# Altium schematic symbol library TI - ADC.SchLib: 2198 symbols (part 33 of 130) (continued)
## ADS5240IPAPG4
designator U?
4-Channel, 12-Bit, 40 MSPS ADC with Serial LVDS Interface, -40 to 85 degC, 64-pin QFP (PAP64), Green (RoHS & no Sb/Br); Manufacturer: Texas Instruments; PartNumber: ADS5240IPAPG4; # Input Channels: 4; Analog Voltage AV/DD(Max)(V): 3.6; Analog Voltage AV/DD(Min)(V): 3; Architecture: Pipeline; ENOB(Bits): 11.3; INL(Max)(+/-LSB): 2; Interface: Parallel LVDS; Resolution(Bits): 12; Sample Rate (max)(SPS): 40M; SFDR(dB): 87; SINAD(dB): 70; SNR(dB): 70.5; SubFamily: High Speed ADC (>10MSPS); DatasheetVersion: SBAS326E; PackageVersion: 4147702/C, 08/2003; PackageReference: PAP64-5900X5900TP; PackageDescription: 64-Pin PowerPAD(TM) Plastic Quad Flatpack, Body 10 x 10 mm, Pitch 0.5 mm; Supplier 1: Digi-Key; Supplier Part Number 1: ADS8322Y/250TR-ND; Digital Supply(Max)(V): 3.6; Digital Supply(Min)(V): 3; Eco-Plan: Green (RoHS & no Sb/Br); Mounting Technology: Surface Mount; Code_JEDEC: MS-026; ComponentLink1Description: Manufacturer URL; ComponentLink1URL: http://www.ti.com/; ComponentLink2Description: Datasheet; ComponentLink2URL: http://www.ti.com/general/docs/lit/getliterature.tsp?genericPartNumber=ADS5240&fileType=pdf; ComponentLink3Description: Package Specification; ComponentLink3URL: http://www.ti.com/lit/ml/mpqf071b/mpqf071b.pdf
footprint TI-PAP64-5900X5900TP_N (QFP, 64-Leads, Body 10x10mm, Pitch 0.5mm, Thermal Pad 6.5x6.5mm, IPC Medium Density)
footprint TI-PAP64-5900X5900TP_L (QFP, 64-Leads, Body 10x10mm, Pitch 0.5mm, Thermal Pad 6.5x6.5mm, IPC High Density)
footprint TI-PAP64-5900X5900TP_M (QFP, 64-Leads, Body 10x10mm, Pitch 0.5mm, Thermal Pad 6.5x6.5mm, IPC Low Density)
part A pins: 2 IN1P (in) "Channel 1 Differential Analog Input High", 3 IN1N (in) "Channel 1 Differential Analog Input Low", 7 IN2P (in) "Channel 2 Differential Analog Input High", 8 IN2N (in) "Channel 2 Differential Analog Input Low", 12 PD (in) "Power-Down; 0 = Normal, 1 = Power-Down. Weak pull-down to ground.", 15 LCLKP (out) "Positive LVDS Clock", 16 LCLKN (out) "Negative LVDS Clock", 19 OUT1P (out) "Channel 1 Positive LVDS Data Output", 20 OUT1N (out) "Channel 1 Negative LVDS Data Output", 23 OUT2P (out) "Channel 2 Positive LVDS Data Output", 24 OUT2N (out) "Channel 2 Negative LVDS Data Output", 25 OUT3P (out) "Channel 3 Positive LVDS Data Output", 26 OUT3N (out) "Channel 3 Negative LVDS Data Output", 29 OUT4P (out) "Channel 4 Positive LVDS Data Output", 30 OUT4N (out) "Channel 4 Negative LVDS Data Output", 33 ADCLKP (out) "Positive LVDS ADC Clock Output", 34 ADCLKN (out) "Negative LVDS ADC Clock Output", 37 ~{RESET} (in) "Reset to Default; 0 = Reset, 1 = Normal. Weak pull-down to ground.", 41 IN3P (in) "Channel 3 Differential Analog Input High", 42 IN3N (in) "Channel 3 Differential Analog Input Low", 46 IN4P (in) "Channel 4 Differential Analog Input High", 47 IN4N (in) "Channel 4 Differential Analog Input Low", 50 ISET (in) "Bias Current Setting Resistor of 56.2kOhm to Ground", 51 VCM (out) "Common-Mode Output Voltage", 52 REFB "Reference Bottom Voltage (2Ohm resistor in series with a capacitor >= 0.1uF to ground)", 53 REFT "Reference Top Voltage (2Ohm resistor in series with a capacitor >= 0.1uF to ground)", 54 INT/~{EXT} (in) "Internal/External Reference Select; 0 = External, 1 = Internal. Weak pull-up to supply.", 56 ADCLK (in) "Data Converter Clock Input", 61 ~{CS} (in) "Chip Select; 0 = Select, 1 = No Select", 62 SDATA (in) "Serial Data Input", 63 SCLK (in) "Serial Data Clock"
part B pins: 1 AVDD (power) "Analog Power Supply", 4 AVSS (power) "Analog Ground", 5 AVDD (power) "Analog Power Supply", 6 AVSS (power) "Analog Ground", 9 AVSS (power) "Analog Ground", 10 AVDD (power) "Analog Power Supply", 11 LVSS (power) "LVDS Ground", 13 LVSS (power) "LVDS Ground", 14 LVSS (power) "LVDS Ground", 21 LVDD (power) "LVDS Power Supply", 22 LVSS (power) "LVDS Ground", 27 LVDD (power) "LVDS Power Supply", 28 LVSS (power) "LVDS Ground", 35 LVSS (power) "LVDS Ground", 36 LVSS (power) "LVDS Ground", 38 LVSS (power) "LVDS Ground", 39 AVDD (power) "Analog Power Supply", 40 AVSS (power) "Analog Ground", 43 AVSS (power) "Analog Ground", 44 AVDD (power) "Analog Power Supply", 45 AVSS (power) "Analog Ground", 48 AVDD (power) "Analog Power Supply", 49 AVSS (power) "Analog Ground", 55 AVDD (power) "Analog Power Supply", 57 AVSS (power) "Analog Ground", 58 AVSS (power) "Analog Ground", 59 AVSS (power) "Analog Ground", 60 AVDD (power) "Analog Power Supply", 64 AVSS (power) "Analog Ground", 65 EP
part C pins: 17 NC "No Connection", 18 NC "No Connection", 31 NC "No Connection", 32 NC "No Connection"

## ADS5240IPAPT
designator U?
4-Channel, 12-Bit, 40 MSPS ADC with Serial LVDS Interface, -40 to 85 degC, 64-pin QFP (PAP64), Green (RoHS & no Sb/Br); Manufacturer: Texas Instruments; PartNumber: ADS5240IPAPT; # Input Channels: 4; Analog Voltage AV/DD(Max)(V): 3.6; Analog Voltage AV/DD(Min)(V): 3; Architecture: Pipeline; ENOB(Bits): 11.3; INL(Max)(+/-LSB): 2; Interface: Parallel LVDS; Resolution(Bits): 12; Sample Rate (max)(SPS): 40M; SFDR(dB): 87; SINAD(dB): 70; SNR(dB): 70.5; SubFamily: High Speed ADC (>10MSPS); DatasheetVersion: SBAS326E; PackageVersion: 4147702/C, 08/2003; PackageReference: PAP64-5900X5900TP; PackageDescription: 64-Pin PowerPAD(TM) Plastic Quad Flatpack, Body 10 x 10 mm, Pitch 0.5 mm; Supplier 1: Digi-Key; Supplier Part Number 1: ADS8322Y/250G4-ND; Digital Supply(Max)(V): 3.6; Digital Supply(Min)(V): 3; Eco-Plan: Green (RoHS & no Sb/Br); Mounting Technology: Surface Mount; Code_JEDEC: MS-026; ComponentLink1Description: Manufacturer URL; ComponentLink1URL: http://www.ti.com/; ComponentLink2Description: Datasheet; ComponentLink2URL: http://www.ti.com/general/docs/lit/getliterature.tsp?genericPartNumber=ADS5240&fileType=pdf; ComponentLink3Description: Package Specification; ComponentLink3URL: http://www.ti.com/lit/ml/mpqf071b/mpqf071b.pdf
footprint TI-PAP64-5900X5900TP_N (QFP, 64-Leads, Body 10x10mm, Pitch 0.5mm, Thermal Pad 6.5x6.5mm, IPC Medium Density)
footprint TI-PAP64-5900X5900TP_L (QFP, 64-Leads, Body 10x10mm, Pitch 0.5mm, Thermal Pad 6.5x6.5mm, IPC High Density)
footprint TI-PAP64-5900X5900TP_M (QFP, 64-Leads, Body 10x10mm, Pitch 0.5mm, Thermal Pad 6.5x6.5mm, IPC Low Density)
part A pins: 2 IN1P (in) "Channel 1 Differential Analog Input High", 3 IN1N (in) "Channel 1 Differential Analog Input Low", 7 IN2P (in) "Channel 2 Differential Analog Input High", 8 IN2N (in) "Channel 2 Differential Analog Input Low", 12 PD (in) "Power-Down; 0 = Normal, 1 = Power-Down. Weak pull-down to ground.", 15 LCLKP (out) "Positive LVDS Clock", 16 LCLKN (out) "Negative LVDS Clock", 19 OUT1P (out) "Channel 1 Positive LVDS Data Output", 20 OUT1N (out) "Channel 1 Negative LVDS Data Output", 23 OUT2P (out) "Channel 2 Positive LVDS Data Output", 24 OUT2N (out) "Channel 2 Negative LVDS Data Output", 25 OUT3P (out) "Channel 3 Positive LVDS Data Output", 26 OUT3N (out) "Channel 3 Negative LVDS Data Output", 29 OUT4P (out) "Channel 4 Positive LVDS Data Output", 30 OUT4N (out) "Channel 4 Negative LVDS Data Output", 33 ADCLKP (out) "Positive LVDS ADC Clock Output", 34 ADCLKN (out) "Negative LVDS ADC Clock Output", 37 ~{RESET} (in) "Reset to Default; 0 = Reset, 1 = Normal. Weak pull-down to ground.", 41 IN3P (in) "Channel 3 Differential Analog Input High", 42 IN3N (in) "Channel 3 Differential Analog Input Low", 46 IN4P (in) "Channel 4 Differential Analog Input High", 47 IN4N (in) "Channel 4 Differential Analog Input Low", 50 ISET (in) "Bias Current Setting Resistor of 56.2kOhm to Ground", 51 VCM (out) "Common-Mode Output Voltage", 52 REFB "Reference Bottom Voltage (2Ohm resistor in series with a capacitor >= 0.1uF to ground)", 53 REFT "Reference Top Voltage (2Ohm resistor in series with a capacitor >= 0.1uF to ground)", 54 INT/~{EXT} (in) "Internal/External Reference Select; 0 = External, 1 = Internal. Weak pull-up to supply.", 56 ADCLK (in) "Data Converter Clock Input", 61 ~{CS} (in) "Chip Select; 0 = Select, 1 = No Select", 62 SDATA (in) "Serial Data Input", 63 SCLK (in) "Serial Data Clock"
part B pins: 1 AVDD (power) "Analog Power Supply", 4 AVSS (power) "Analog Ground", 5 AVDD (power) "Analog Power Supply", 6 AVSS (power) "Analog Ground", 9 AVSS (power) "Analog Ground", 10 AVDD (power) "Analog Power Supply", 11 LVSS (power) "LVDS Ground", 13 LVSS (power) "LVDS Ground", 14 LVSS (power) "LVDS Ground", 21 LVDD (power) "LVDS Power Supply", 22 LVSS (power) "LVDS Ground", 27 LVDD (power) "LVDS Power Supply", 28 LVSS (power) "LVDS Ground", 35 LVSS (power) "LVDS Ground", 36 LVSS (power) "LVDS Ground", 38 LVSS (power) "LVDS Ground", 39 AVDD (power) "Analog Power Supply", 40 AVSS (power) "Analog Ground", 43 AVSS (power) "Analog Ground", 44 AVDD (power) "Analog Power Supply", 45 AVSS (power) "Analog Ground", 48 AVDD (power) "Analog Power Supply", 49 AVSS (power) "Analog Ground", 55 AVDD (power) "Analog Power Supply", 57 AVSS (power) "Analog Ground", 58 AVSS (power) "Analog Ground", 59 AVSS (power) "Analog Ground", 60 AVDD (power) "Analog Power Supply", 64 AVSS (power) "Analog Ground", 65 EP
part C pins: 17 NC "No Connection", 18 NC "No Connection", 31 NC "No Connection", 32 NC "No Connection"

## ADS5240IPAPTG4
designator U?
4-Channel, 12-Bit, 40 MSPS ADC with Serial LVDS Interface, -40 to 85 degC, 64-pin QFP (PAP64), Green (RoHS & no Sb/Br); Manufacturer: Texas Instruments; PartNumber: ADS5240IPAPTG4; # Input Channels: 4; Analog Voltage AV/DD(Max)(V): 3.6; Analog Voltage AV/DD(Min)(V): 3; Architecture: Pipeline; ENOB(Bits): 11.3; INL(Max)(+/-LSB): 2; Interface: Parallel LVDS; Resolution(Bits): 12; Sample Rate (max)(SPS): 40M; SFDR(dB): 87; SINAD(dB): 70; SNR(dB): 70.5; SubFamily: High Speed ADC (>10MSPS); DatasheetVersion: SBAS326E; PackageVersion: 4147702/C, 08/2003; PackageReference: PAP64-5900X5900TP; PackageDescription: 64-Pin PowerPAD(TM) Plastic Quad Flatpack, Body 10 x 10 mm, Pitch 0.5 mm; Supplier 1: Digi-Key; Supplier Part Number 1: ADS8322Y/2KTR-ND; Digital Supply(Max)(V): 3.6; Digital Supply(Min)(V): 3; Eco-Plan: Green (RoHS & no Sb/Br); Mounting Technology: Surface Mount; Code_JEDEC: MS-026; ComponentLink1Description: Manufacturer URL; ComponentLink1URL: http://www.ti.com/; ComponentLink2Description: Datasheet; ComponentLink2URL: http://www.ti.com/general/docs/lit/getliterature.tsp?genericPartNumber=ADS5240&fileType=pdf; ComponentLink3Description: Package Specification; ComponentLink3URL: http://www.ti.com/lit/ml/mpqf071b/mpqf071b.pdf
footprint TI-PAP64-5900X5900TP_N (QFP, 64-Leads, Body 10x10mm, Pitch 0.5mm, Thermal Pad 6.5x6.5mm, IPC Medium Density)
footprint TI-PAP64-5900X5900TP_L (QFP, 64-Leads, Body 10x10mm, Pitch 0.5mm, Thermal Pad 6.5x6.5mm, IPC High Density)
footprint TI-PAP64-5900X5900TP_M (QFP, 64-Leads, Body 10x10mm, Pitch 0.5mm, Thermal Pad 6.5x6.5mm, IPC Low Density)
part A pins: 2 IN1P (in) "Channel 1 Differential Analog Input High", 3 IN1N (in) "Channel 1 Differential Analog Input Low", 7 IN2P (in) "Channel 2 Differential Analog Input High", 8 IN2N (in) "Channel 2 Differential Analog Input Low", 12 PD (in) "Power-Down; 0 = Normal, 1 = Power-Down. Weak pull-down to ground.", 15 LCLKP (out) "Positive LVDS Clock", 16 LCLKN (out) "Negative LVDS Clock", 19 OUT1P (out) "Channel 1 Positive LVDS Data Output", 20 OUT1N (out) "Channel 1 Negative LVDS Data Output", 23 OUT2P (out) "Channel 2 Positive LVDS Data Output", 24 OUT2N (out) "Channel 2 Negative LVDS Data Output", 25 OUT3P (out) "Channel 3 Positive LVDS Data Output", 26 OUT3N (out) "Channel 3 Negative LVDS Data Output", 29 OUT4P (out) "Channel 4 Positive LVDS Data Output", 30 OUT4N (out) "Channel 4 Negative LVDS Data Output", 33 ADCLKP (out) "Positive LVDS ADC Clock Output", 34 ADCLKN (out) "Negative LVDS ADC Clock Output", 37 ~{RESET} (in) "Reset to Default; 0 = Reset, 1 = Normal. Weak pull-down to ground.", 41 IN3P (in) "Channel 3 Differential Analog Input High", 42 IN3N (in) "Channel 3 Differential Analog Input Low", 46 IN4P (in) "Channel 4 Differential Analog Input High", 47 IN4N (in) "Channel 4 Differential Analog Input Low", 50 ISET (in) "Bias Current Setting Resistor of 56.2kOhm to Ground", 51 VCM (out) "Common-Mode Output Voltage", 52 REFB "Reference Bottom Voltage (2Ohm resistor in series with a capacitor >= 0.1uF to ground)", 53 REFT "Reference Top Voltage (2Ohm resistor in series with a capacitor >= 0.1uF to ground)", 54 INT/~{EXT} (in) "Internal/External Reference Select; 0 = External, 1 = Internal. Weak pull-up to supply.", 56 ADCLK (in) "Data Converter Clock Input", 61 ~{CS} (in) "Chip Select; 0 = Select, 1 = No Select", 62 SDATA (in) "Serial Data Input", 63 SCLK (in) "Serial Data Clock"
part B pins: 1 AVDD (power) "Analog Power Supply", 4 AVSS (power) "Analog Ground", 5 AVDD (power) "Analog Power Supply", 6 AVSS (power) "Analog Ground", 9 AVSS (power) "Analog Ground", 10 AVDD (power) "Analog Power Supply", 11 LVSS (power) "LVDS Ground", 13 LVSS (power) "LVDS Ground", 14 LVSS (power) "LVDS Ground", 21 LVDD (power) "LVDS Power Supply", 22 LVSS (power) "LVDS Ground", 27 LVDD (power) "LVDS Power Supply", 28 LVSS (power) "LVDS Ground", 35 LVSS (power) "LVDS Ground", 36 LVSS (power) "LVDS Ground", 38 LVSS (power) "LVDS Ground", 39 AVDD (power) "Analog Power Supply", 40 AVSS (power) "Analog Ground", 43 AVSS (power) "Analog Ground", 44 AVDD (power) "Analog Power Supply", 45 AVSS (power) "Analog Ground", 48 AVDD (power) "Analog Power Supply", 49 AVSS (power) "Analog Ground", 55 AVDD (power) "Analog Power Supply", 57 AVSS (power) "Analog Ground", 58 AVSS (power) "Analog Ground", 59 AVSS (power) "Analog Ground", 60 AVDD (power) "Analog Power Supply", 64 AVSS (power) "Analog Ground", 65 EP
part C pins: 17 NC "No Connection", 18 NC "No Connection", 31 NC "No Connection", 32 NC "No Connection"

## ADS5242IPAP
designator U?
4-Channel, 12-Bit, 65 MSPS ADC with Serial LVDS Interface, -40 to 85 degC, 64-pin QFP (PAP64), Green (RoHS & no Sb/Br); Manufacturer: Texas Instruments; PartNumber: ADS5242IPAP; # Input Channels: 4; Analog Voltage AV/DD(Max)(V): 3.6; Analog Voltage AV/DD(Min)(V): 3; Architecture: Pipeline; ENOB(Bits): 11.5; INL(Max)(+/-LSB): 2.5; Interface: Parallel LVDS; Resolution(Bits): 12; Sample Rate (max)(SPS): 65M; SFDR(dB): 88; SINAD(dB): 70.9; SNR(dB): 71.1; SubFamily: High Speed ADC (>10MSPS); DatasheetVersion: SBAS330C; PackageVersion: 4147702/C, 08/2003; PackageReference: PAP64-5900X5900TP; PackageDescription: 64-Pin PowerPAD(TM) Plastic Quad Flatpack, Body 10 x 10 mm, Pitch 0.5 mm; Supplier 1: Digi-Key; Supplier Part Number 1: ADS8322Y/2KG4-ND; Digital Supply(Max)(V): 3.6; Digital Supply(Min)(V): 3; Eco-Plan: Green (RoHS & no Sb/Br); Mounting Technology: Surface Mount; Code_JEDEC: MS-026; ComponentLink1Description: Manufacturer URL; ComponentLink1URL: http://www.ti.com/; ComponentLink2Description: Datasheet; ComponentLink2URL: http://www.ti.com/general/docs/lit/getliterature.tsp?genericPartNumber=ADS5242&fileType=pdf; ComponentLink3Description: Package Specification; ComponentLink3URL: http://www.ti.com/lit/ml/mpqf071b/mpqf071b.pdf
footprint TI-PAP64-5900X5900TP_N (QFP, 64-Leads, Body 10x10mm, Pitch 0.5mm, Thermal Pad 6.5x6.5mm, IPC Medium Density)
footprint TI-PAP64-5900X5900TP_L (QFP, 64-Leads, Body 10x10mm, Pitch 0.5mm, Thermal Pad 6.5x6.5mm, IPC High Density)
footprint TI-PAP64-5900X5900TP_M (QFP, 64-Leads, Body 10x10mm, Pitch 0.5mm, Thermal Pad 6.5x6.5mm, IPC Low Density)
part A pins: 2 IN1P (in) "Channel 1 Differential Analog Input High", 3 IN1N (in) "Channel 1 Differential Analog Input Low", 7 IN2P (in) "Channel 2 Differential Analog Input High", 8 IN2N (in) "Channel 2 Differential Analog Input Low", 12 PD (in) "Power-Down; 0 = Normal, 1 = Power-Down. Weak pull-down to ground.", 15 LCLKP (out) "Positive LVDS Clock", 16 LCLKN (out) "Negative LVDS Clock", 19 OUT1P (out) "Channel 1 Positive LVDS Data Output", 20 OUT1N (out) "Channel 1 Negative LVDS Data Output", 23 OUT2P (out) "Channel 2 Positive LVDS Data Output", 24 OUT2N (out) "Channel 2 Negative LVDS Data Output", 25 OUT3P (out) "Channel 3 Positive LVDS Data Output", 26 OUT3N (out) "Channel 3 Negative LVDS Data Output", 29 OUT4P (out) "Channel 4 Positive LVDS Data Output", 30 OUT4N (out) "Channel 4 Negative LVDS Data Output", 33 ADCLKP (out) "Positive LVDS ADC Clock Output", 34 ADCLKN (out) "Negative LVDS ADC Clock Output", 37 ~{RESET} (in) "Reset to Default; 0 = Reset, 1 = Normal. Weak pull-down to ground.", 41 IN3P (in) "Channel 3 Differential Analog Input High", 42 IN3N (in) "Channel 3 Differential Analog Input Low", 46 IN4P (in) "Channel 4 Differential Analog Input High", 47 IN4N (in) "Channel 4 Differential Analog Input Low", 50 ISET (in) "Bias Current Setting Resistor of 56.2kOhm to Ground", 51 VCM (out) "Common-Mode Output Voltage", 52 REFB "Reference Bottom Voltage (2Ohm resistor in series with a capacitor >= 0.1uF to ground)", 53 REFT "Reference Top Voltage (2Ohm resistor in series with a capacitor >= 0.1uF to ground)", 54 INT/~{EXT} (in) "Internal/External Reference Select; 0 = External, 1 = Internal. Weak pull-up to supply.", 56 ADCLK (in) "Data Converter Clock Input", 61 ~{CS} (in) "Chip Select; 0 = Select, 1 = No Select", 62 SDA (in) "Serial Data Input", 63 SCLK (in) "Serial Data Clock"
part B pins: 1 AVDD (power) "Analog Power Supply", 4 AVSS (power) "Analog Ground", 5 AVDD (power) "Analog Power Supply", 6 AVSS (power) "Analog Ground", 9 AVSS (power) "Analog Ground", 10 AVDD (power) "Analog Power Supply", 11 LVSS (power) "LVDS Ground", 13 LVSS (power) "LVDS Ground", 14 LVSS (power) "LVDS Ground", 21 LVDD (power) "LVDS Power Supply", 22 LVSS (power) "LVDS Ground", 27 LVDD (power) "LVDS Power Supply", 28 LVSS (power) "LVDS Ground", 35 LVSS (power) "LVDS Ground", 36 LVSS (power) "LVDS Ground", 38 LVSS (power) "LVDS Ground", 39 AVDD (power) "Analog Power Supply", 40 AVSS (power) "Analog Ground", 43 AVSS (power) "Analog Ground", 44 AVDD (power) "Analog Power Supply", 45 AVSS (power) "Analog Ground", 48 AVDD (power) "Analog Power Supply", 49 AVSS (power) "Analog Ground", 55 AVDD (power) "Analog Power Supply", 57 AVSS (power) "Analog Ground", 58 AVSS (power) "Analog Ground", 59 AVSS (power) "Analog Ground", 60 AVDD (power) "Analog Power Supply", 64 AVSS (power) "Analog Ground", 65 EP
part C pins: 17 NC "No Connection", 18 NC "No Connection", 31 NC "No Connection", 32 NC "No Connection"

## ADS5242IPAPG4
designator U?
4-Channel, 12-Bit, 65 MSPS ADC with Serial LVDS Interface, -40 to 85 degC, 64-pin QFP (PAP64), Green (RoHS & no Sb/Br); Manufacturer: Texas Instruments; PartNumber: ADS5242IPAPG4; # Input Channels: 4; Analog Voltage AV/DD(Max)(V): 3.6; Analog Voltage AV/DD(Min)(V): 3; Architecture: Pipeline; ENOB(Bits): 11.5; INL(Max)(+/-LSB): 2.5; Interface: Parallel LVDS; Resolution(Bits): 12; Sample Rate (max)(SPS): 65M; SFDR(dB): 88; SINAD(dB): 70.9; SNR(dB): 71.1; SubFamily: High Speed ADC (>10MSPS); DatasheetVersion: SBAS330C; PackageVersion: 4147702/C, 08/2003; PackageReference: PAP64-5900X5900TP; PackageDescription: 64-Pin PowerPAD(TM) Plastic Quad Flatpack, Body 10 x 10 mm, Pitch 0.5 mm; Supplier 1: Digi-Key; Supplier Part Number 1: 296-13772-2-ND; Digital Supply(Max)(V): 3.6; Digital Supply(Min)(V): 3; Eco-Plan: Green (RoHS & no Sb/Br); Mounting Technology: Surface Mount; Code_JEDEC: MS-026; ComponentLink1Description: Manufacturer URL; ComponentLink1URL: http://www.ti.com/; ComponentLink2Description: Datasheet; ComponentLink2URL: http://www.ti.com/general/docs/lit/getliterature.tsp?genericPartNumber=ADS5242&fileType=pdf; ComponentLink3Description: Package Specification; ComponentLink3URL: http://www.ti.com/lit/ml/mpqf071b/mpqf071b.pdf
footprint TI-PAP64-5900X5900TP_N (QFP, 64-Leads, Body 10x10mm, Pitch 0.5mm, Thermal Pad 6.5x6.5mm, IPC Medium Density)
footprint TI-PAP64-5900X5900TP_L (QFP, 64-Leads, Body 10x10mm, Pitch 0.5mm, Thermal Pad 6.5x6.5mm, IPC High Density)
footprint TI-PAP64-5900X5900TP_M (QFP, 64-Leads, Body 10x10mm, Pitch 0.5mm, Thermal Pad 6.5x6.5mm, IPC Low Density)
part A pins: 2 IN1P (in) "Channel 1 Differential Analog Input High", 3 IN1N (in) "Channel 1 Differential Analog Input Low", 7 IN2P (in) "Channel 2 Differential Analog Input High", 8 IN2N (in) "Channel 2 Differential Analog Input Low", 12 PD (in) "Power-Down; 0 = Normal, 1 = Power-Down. Weak pull-down to ground.", 15 LCLKP (out) "Positive LVDS Clock", 16 LCLKN (out) "Negative LVDS Clock", 19 OUT1P (out) "Channel 1 Positive LVDS Data Output", 20 OUT1N (out) "Channel 1 Negative LVDS Data Output", 23 OUT2P (out) "Channel 2 Positive LVDS Data Output", 24 OUT2N (out) "Channel 2 Negative LVDS Data Output", 25 OUT3P (out) "Channel 3 Positive LVDS Data Output", 26 OUT3N (out) "Channel 3 Negative LVDS Data Output", 29 OUT4P (out) "Channel 4 Positive LVDS Data Output", 30 OUT4N (out) "Channel 4 Negative LVDS Data Output", 33 ADCLKP (out) "Positive LVDS ADC Clock Output", 34 ADCLKN (out) "Negative LVDS ADC Clock Output", 37 ~{RESET} (in) "Reset to Default; 0 = Reset, 1 = Normal. Weak pull-down to ground.", 41 IN3P (in) "Channel 3 Differential Analog Input High", 42 IN3N (in) "Channel 3 Differential Analog Input Low", 46 IN4P (in) "Channel 4 Differential Analog Input High", 47 IN4N (in) "Channel 4 Differential Analog Input Low", 50 ISET (in) "Bias Current Setting Resistor of 56.2kOhm to Ground", 51 VCM (out) "Common-Mode Output Voltage", 52 REFB "Reference Bottom Voltage (2Ohm resistor in series with a capacitor >= 0.1uF to ground)", 53 REFT "Reference Top Voltage (2Ohm resistor in series with a capacitor >= 0.1uF to ground)", 54 INT/~{EXT} (in) "Internal/External Reference Select; 0 = External, 1 = Internal. Weak pull-up to supply.", 56 ADCLK (in) "Data Converter Clock Input", 61 ~{CS} (in) "Chip Select; 0 = Select, 1 = No Select", 62 SDA (in) "Serial Data Input", 63 SCLK (in) "Serial Data Clock"
part B pins: 1 AVDD (power) "Analog Power Supply", 4 AVSS (power) "Analog Ground", 5 AVDD (power) "Analog Power Supply", 6 AVSS (power) "Analog Ground", 9 AVSS (power) "Analog Ground", 10 AVDD (power) "Analog Power Supply", 11 LVSS (power) "LVDS Ground", 13 LVSS (power) "LVDS Ground", 14 LVSS (power) "LVDS Ground", 21 LVDD (power) "LVDS Power Supply", 22 LVSS (power) "LVDS Ground", 27 LVDD (power) "LVDS Power Supply", 28 LVSS (power) "LVDS Ground", 35 LVSS (power) "LVDS Ground", 36 LVSS (power) "LVDS Ground", 38 LVSS (power) "LVDS Ground", 39 AVDD (power) "Analog Power Supply", 40 AVSS (power) "Analog Ground", 43 AVSS (power) "Analog Ground", 44 AVDD (power) "Analog Power Supply", 45 AVSS (power) "Analog Ground", 48 AVDD (power) "Analog Power Supply", 49 AVSS (power) "Analog Ground", 55 AVDD (power) "Analog Power Supply", 57 AVSS (power) "Analog Ground", 58 AVSS (power) "Analog Ground", 59 AVSS (power) "Analog Ground", 60 AVDD (power) "Analog Power Supply", 64 AVSS (power) "Analog Ground", 65 EP
part C pins: 17 NC "No Connection", 18 NC "No Connection", 31 NC "No Connection", 32 NC "No Connection"

## ADS5242IPAPT
designator U?
4-Channel, 12-Bit, 65 MSPS ADC with Serial LVDS Interface, -40 to 85 degC, 64-pin QFP (PAP64), Green (RoHS & no Sb/Br); Manufacturer: Texas Instruments; PartNumber: ADS5242IPAPT; # Input Channels: 4; Analog Voltage AV/DD(Max)(V): 3.6; Analog Voltage AV/DD(Min)(V): 3; Architecture: Pipeline; ENOB(Bits): 11.5; INL(Max)(+/-LSB): 2.5; Interface: Parallel LVDS; Resolution(Bits): 12; Sample Rate (max)(SPS): 65M; SFDR(dB): 88; SINAD(dB): 70.9; SNR(dB): 71.1; SubFamily: High Speed ADC (>10MSPS); DatasheetVersion: SBAS330C; PackageVersion: 4147702/C, 08/2003; PackageReference: PAP64-5900X5900TP; PackageDescription: 64-Pin PowerPAD(TM) Plastic Quad Flatpack, Body 10 x 10 mm, Pitch 0.5 mm; Supplier 1: Digi-Key; Supplier Part Number 1: ADS8322YB/250G4-ND; Digital Supply(Max)(V): 3.6; Digital Supply(Min)(V): 3; Eco-Plan: Green (RoHS & no Sb/Br); Mounting Technology: Surface Mount; Code_JEDEC: MS-026; ComponentLink1Description: Manufacturer URL; ComponentLink1URL: http://www.ti.com/; ComponentLink2Description: Datasheet; ComponentLink2URL: http://www.ti.com/general/docs/lit/getliterature.tsp?genericPartNumber=ADS5242&fileType=pdf; ComponentLink3Description: Package Specification; ComponentLink3URL: http://www.ti.com/lit/ml/mpqf071b/mpqf071b.pdf
footprint TI-PAP64-5900X5900TP_N (QFP, 64-Leads, Body 10x10mm, Pitch 0.5mm, Thermal Pad 6.5x6.5mm, IPC Medium Density)
footprint TI-PAP64-5900X5900TP_L (QFP, 64-Leads, Body 10x10mm, Pitch 0.5mm, Thermal Pad 6.5x6.5mm, IPC High Density)
footprint TI-PAP64-5900X5900TP_M (QFP, 64-Leads, Body 10x10mm, Pitch 0.5mm, Thermal Pad 6.5x6.5mm, IPC Low Density)
part A pins: 2 IN1P (in) "Channel 1 Differential Analog Input High", 3 IN1N (in) "Channel 1 Differential Analog Input Low", 7 IN2P (in) "Channel 2 Differential Analog Input High", 8 IN2N (in) "Channel 2 Differential Analog Input Low", 12 PD (in) "Power-Down; 0 = Normal, 1 = Power-Down. Weak pull-down to ground.", 15 LCLKP (out) "Positive LVDS Clock", 16 LCLKN (out) "Negative LVDS Clock", 19 OUT1P (out) "Channel 1 Positive LVDS Data Output", 20 OUT1N (out) "Channel 1 Negative LVDS Data Output", 23 OUT2P (out) "Channel 2 Positive LVDS Data Output", 24 OUT2N (out) "Channel 2 Negative LVDS Data Output", 25 OUT3P (out) "Channel 3 Positive LVDS Data Output", 26 OUT3N (out) "Channel 3 Negative LVDS Data Output", 29 OUT4P (out) "Channel 4 Positive LVDS Data Output", 30 OUT4N (out) "Channel 4 Negative LVDS Data Output", 33 ADCLKP (out) "Positive LVDS ADC Clock Output", 34 ADCLKN (out) "Negative LVDS ADC Clock Output", 37 ~{RESET} (in) "Reset to Default; 0 = Reset, 1 = Normal. Weak pull-down to ground.", 41 IN3P (in) "Channel 3 Differential Analog Input High", 42 IN3N (in) "Channel 3 Differential Analog Input Low", 46 IN4P (in) "Channel 4 Differential Analog Input High", 47 IN4N (in) "Channel 4 Differential Analog Input Low", 50 ISET (in) "Bias Current Setting Resistor of 56.2kOhm to Ground", 51 VCM (out) "Common-Mode Output Voltage", 52 REFB "Reference Bottom Voltage (2Ohm resistor in series with a capacitor >= 0.1uF to ground)", 53 REFT "Reference Top Voltage (2Ohm resistor in series with a capacitor >= 0.1uF to ground)", 54 INT/~{EXT} (in) "Internal/External Reference Select; 0 = External, 1 = Internal. Weak pull-up to supply.", 56 ADCLK (in) "Data Converter Clock Input", 61 ~{CS} (in) "Chip Select; 0 = Select, 1 = No Select", 62 SDA (in) "Serial Data Input", 63 SCLK (in) "Serial Data Clock"
part B pins: 1 AVDD (power) "Analog Power Supply", 4 AVSS (power) "Analog Ground", 5 AVDD (power) "Analog Power Supply", 6 AVSS (power) "Analog Ground", 9 AVSS (power) "Analog Ground", 10 AVDD (power) "Analog Power Supply", 11 LVSS (power) "LVDS Ground", 13 LVSS (power) "LVDS Ground", 14 LVSS (power) "LVDS Ground", 21 LVDD (power) "LVDS Power Supply", 22 LVSS (power) "LVDS Ground", 27 LVDD (power) "LVDS Power Supply", 28 LVSS (power) "LVDS Ground", 35 LVSS (power) "LVDS Ground", 36 LVSS (power) "LVDS Ground", 38 LVSS (power) "LVDS Ground", 39 AVDD (power) "Analog Power Supply", 40 AVSS (power) "Analog Ground", 43 AVSS (power) "Analog Ground", 44 AVDD (power) "Analog Power Supply", 45 AVSS (power) "Analog Ground", 48 AVDD (power) "Analog Power Supply", 49 AVSS (power) "Analog Ground", 55 AVDD (power) "Analog Power Supply", 57 AVSS (power) "Analog Ground", 58 AVSS (power) "Analog Ground", 59 AVSS (power) "Analog Ground", 60 AVDD (power) "Analog Power Supply", 64 AVSS (power) "Analog Ground", 65 EP
part C pins: 17 NC "No Connection", 18 NC "No Connection", 31 NC "No Connection", 32 NC "No Connection"

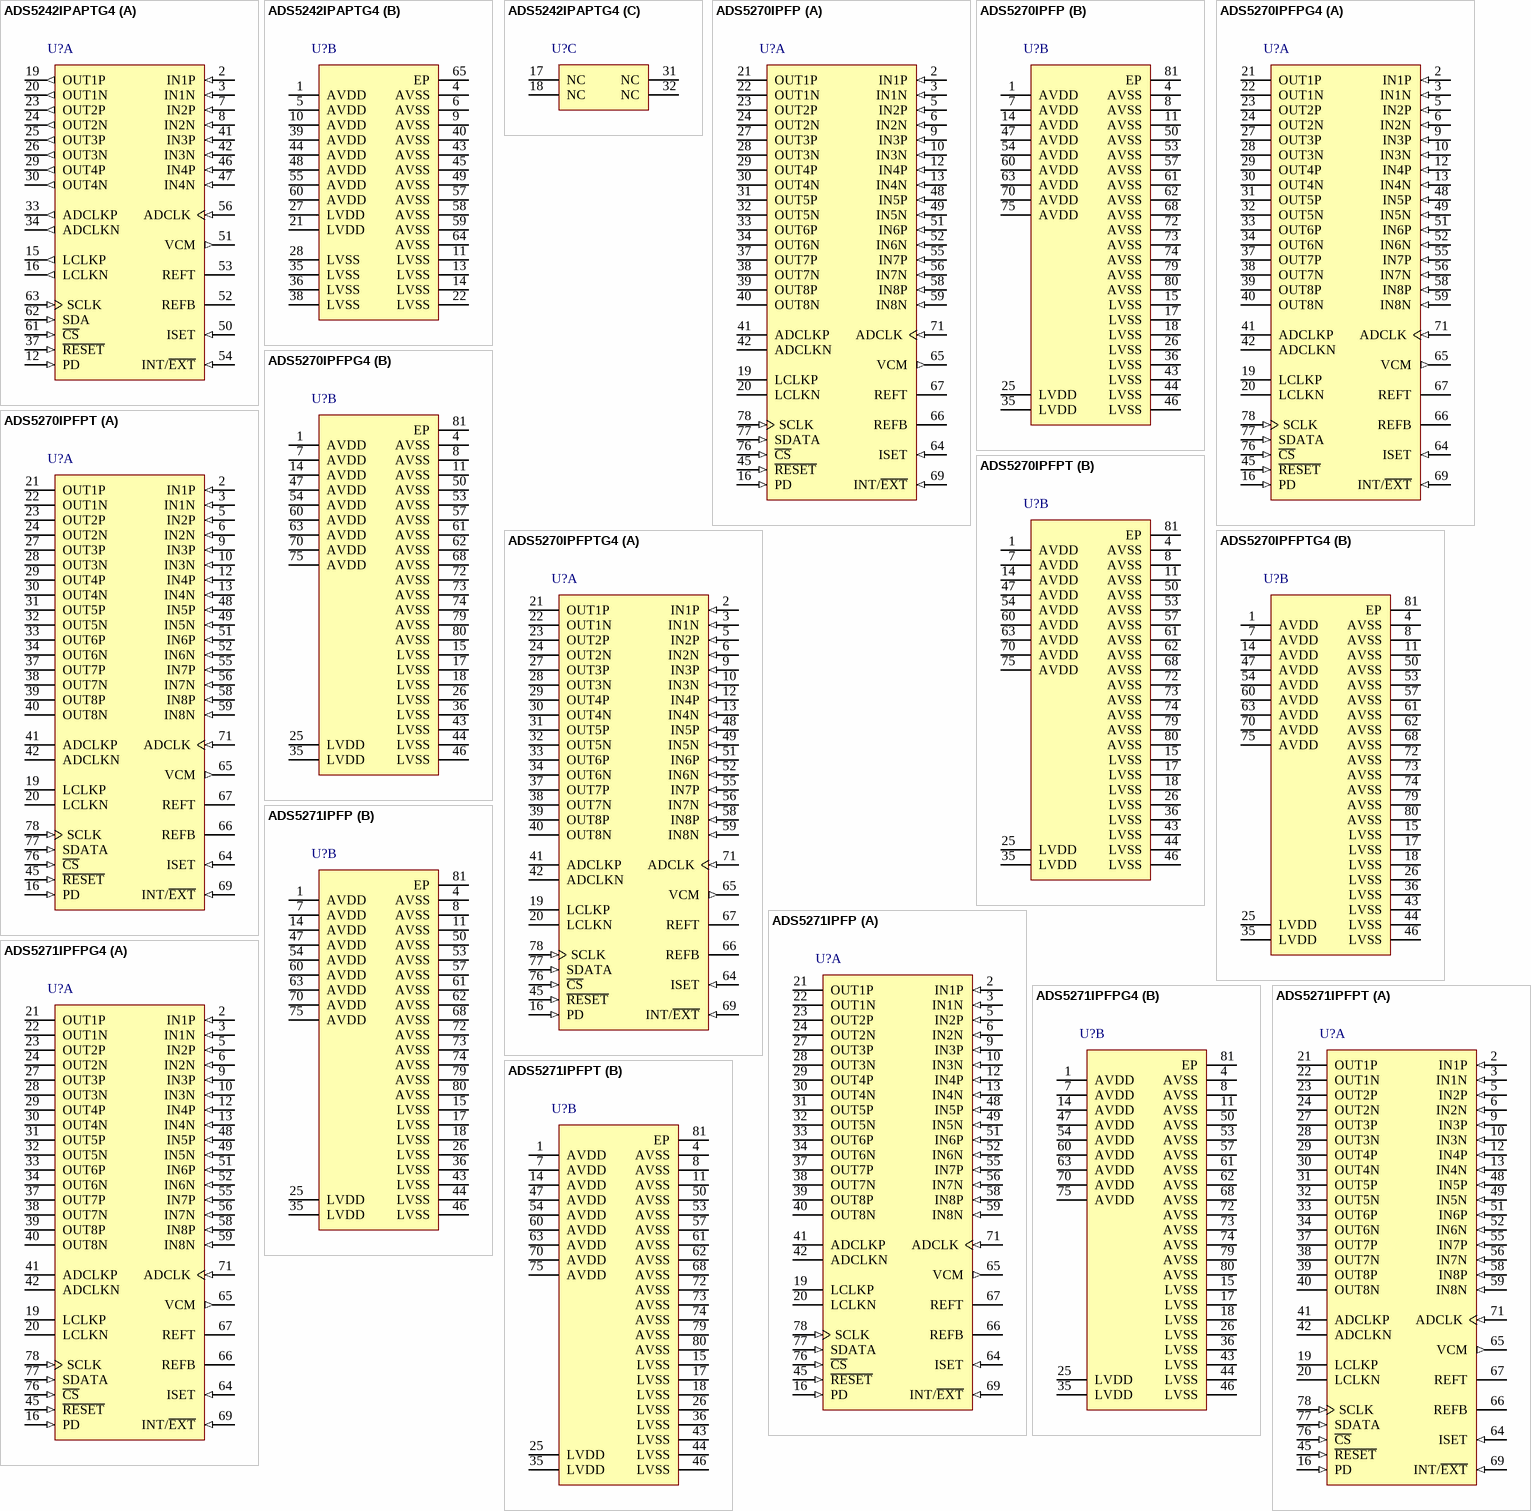
[diagram p41: symbols ADS5242IPAPTG4 to ADS5271IPFPT]

## ADS5242IPAPTG4
designator U?
4-Channel, 12-Bit, 65 MSPS ADC with Serial LVDS Interface, -40 to 85 degC, 64-pin QFP (PAP64), Green (RoHS & no Sb/Br); Manufacturer: Texas Instruments; PartNumber: ADS5242IPAPTG4; # Input Channels: 4; Analog Voltage AV/DD(Max)(V): 3.6; Analog Voltage AV/DD(Min)(V): 3; Architecture: Pipeline; ENOB(Bits): 11.5; INL(Max)(+/-LSB): 2.5; Interface: Parallel LVDS; Resolution(Bits): 12; Sample Rate (max)(SPS): 65M; SFDR(dB): 88; SINAD(dB): 70.9; SNR(dB): 71.1; SubFamily: High Speed ADC (>10MSPS); DatasheetVersion: SBAS330C; PackageVersion: 4147702/C, 08/2003; PackageReference: PAP64-5900X5900TP; PackageDescription: 64-Pin PowerPAD(TM) Plastic Quad Flatpack, Body 10 x 10 mm, Pitch 0.5 mm; Supplier 1: Digi-Key; Supplier Part Number 1: THS1207CDA-ND; Digital Supply(Max)(V): 3.6; Digital Supply(Min)(V): 3; Eco-Plan: Green (RoHS & no Sb/Br); Mounting Technology: Surface Mount; Code_JEDEC: MS-026; ComponentLink1Description: Manufacturer URL; ComponentLink1URL: http://www.ti.com/; ComponentLink2Description: Datasheet; ComponentLink2URL: http://www.ti.com/general/docs/lit/getliterature.tsp?genericPartNumber=ADS5242&fileType=pdf; ComponentLink3Description: Package Specification; ComponentLink3URL: http://www.ti.com/lit/ml/mpqf071b/mpqf071b.pdf
footprint TI-PAP64-5900X5900TP_N (QFP, 64-Leads, Body 10x10mm, Pitch 0.5mm, Thermal Pad 6.5x6.5mm, IPC Medium Density)
footprint TI-PAP64-5900X5900TP_L (QFP, 64-Leads, Body 10x10mm, Pitch 0.5mm, Thermal Pad 6.5x6.5mm, IPC High Density)
footprint TI-PAP64-5900X5900TP_M (QFP, 64-Leads, Body 10x10mm, Pitch 0.5mm, Thermal Pad 6.5x6.5mm, IPC Low Density)
part A pins: 2 IN1P (in) "Channel 1 Differential Analog Input High", 3 IN1N (in) "Channel 1 Differential Analog Input Low", 7 IN2P (in) "Channel 2 Differential Analog Input High", 8 IN2N (in) "Channel 2 Differential Analog Input Low", 12 PD (in) "Power-Down; 0 = Normal, 1 = Power-Down. Weak pull-down to ground.", 15 LCLKP (out) "Positive LVDS Clock", 16 LCLKN (out) "Negative LVDS Clock", 19 OUT1P (out) "Channel 1 Positive LVDS Data Output", 20 OUT1N (out) "Channel 1 Negative LVDS Data Output", 23 OUT2P (out) "Channel 2 Positive LVDS Data Output", 24 OUT2N (out) "Channel 2 Negative LVDS Data Output", 25 OUT3P (out) "Channel 3 Positive LVDS Data Output", 26 OUT3N (out) "Channel 3 Negative LVDS Data Output", 29 OUT4P (out) "Channel 4 Positive LVDS Data Output", 30 OUT4N (out) "Channel 4 Negative LVDS Data Output", 33 ADCLKP (out) "Positive LVDS ADC Clock Output", 34 ADCLKN (out) "Negative LVDS ADC Clock Output", 37 ~{RESET} (in) "Reset to Default; 0 = Reset, 1 = Normal. Weak pull-down to ground.", 41 IN3P (in) "Channel 3 Differential Analog Input High", 42 IN3N (in) "Channel 3 Differential Analog Input Low", 46 IN4P (in) "Channel 4 Differential Analog Input High", 47 IN4N (in) "Channel 4 Differential Analog Input Low", 50 ISET (in) "Bias Current Setting Resistor of 56.2kOhm to Ground", 51 VCM (out) "Common-Mode Output Voltage", 52 REFB "Reference Bottom Voltage (2Ohm resistor in series with a capacitor >= 0.1uF to ground)", 53 REFT "Reference Top Voltage (2Ohm resistor in series with a capacitor >= 0.1uF to ground)", 54 INT/~{EXT} (in) "Internal/External Reference Select; 0 = External, 1 = Internal. Weak pull-up to supply.", 56 ADCLK (in) "Data Converter Clock Input", 61 ~{CS} (in) "Chip Select; 0 = Select, 1 = No Select", 62 SDA (in) "Serial Data Input", 63 SCLK (in) "Serial Data Clock"
part B pins: 1 AVDD (power) "Analog Power Supply", 4 AVSS (power) "Analog Ground", 5 AVDD (power) "Analog Power Supply", 6 AVSS (power) "Analog Ground", 9 AVSS (power) "Analog Ground", 10 AVDD (power) "Analog Power Supply", 11 LVSS (power) "LVDS Ground", 13 LVSS (power) "LVDS Ground", 14 LVSS (power) "LVDS Ground", 21 LVDD (power) "LVDS Power Supply", 22 LVSS (power) "LVDS Ground", 27 LVDD (power) "LVDS Power Supply", 28 LVSS (power) "LVDS Ground", 35 LVSS (power) "LVDS Ground", 36 LVSS (power) "LVDS Ground", 38 LVSS (power) "LVDS Ground", 39 AVDD (power) "Analog Power Supply", 40 AVSS (power) "Analog Ground", 43 AVSS (power) "Analog Ground", 44 AVDD (power) "Analog Power Supply", 45 AVSS (power) "Analog Ground", 48 AVDD (power) "Analog Power Supply", 49 AVSS (power) "Analog Ground", 55 AVDD (power) "Analog Power Supply", 57 AVSS (power) "Analog Ground", 58 AVSS (power) "Analog Ground", 59 AVSS (power) "Analog Ground", 60 AVDD (power) "Analog Power Supply", 64 AVSS (power) "Analog Ground", 65 EP
part C pins: 17 NC "No Connection", 18 NC "No Connection", 31 NC "No Connection", 32 NC "No Connection"